# Altium footprint library PcbLib1.PcbLib: 1016 footprints (part 52 of 64)
Each footprint in its own frame and in the unit in brackets; x right, y up, seen from the top. Pads: shape width x height; smd on the part's side, far side on the other; paste and mask are expansions set on the pad; w line width, h text height; cw(c..) or ccw(c..) is an arc to the next point about the centre after c.
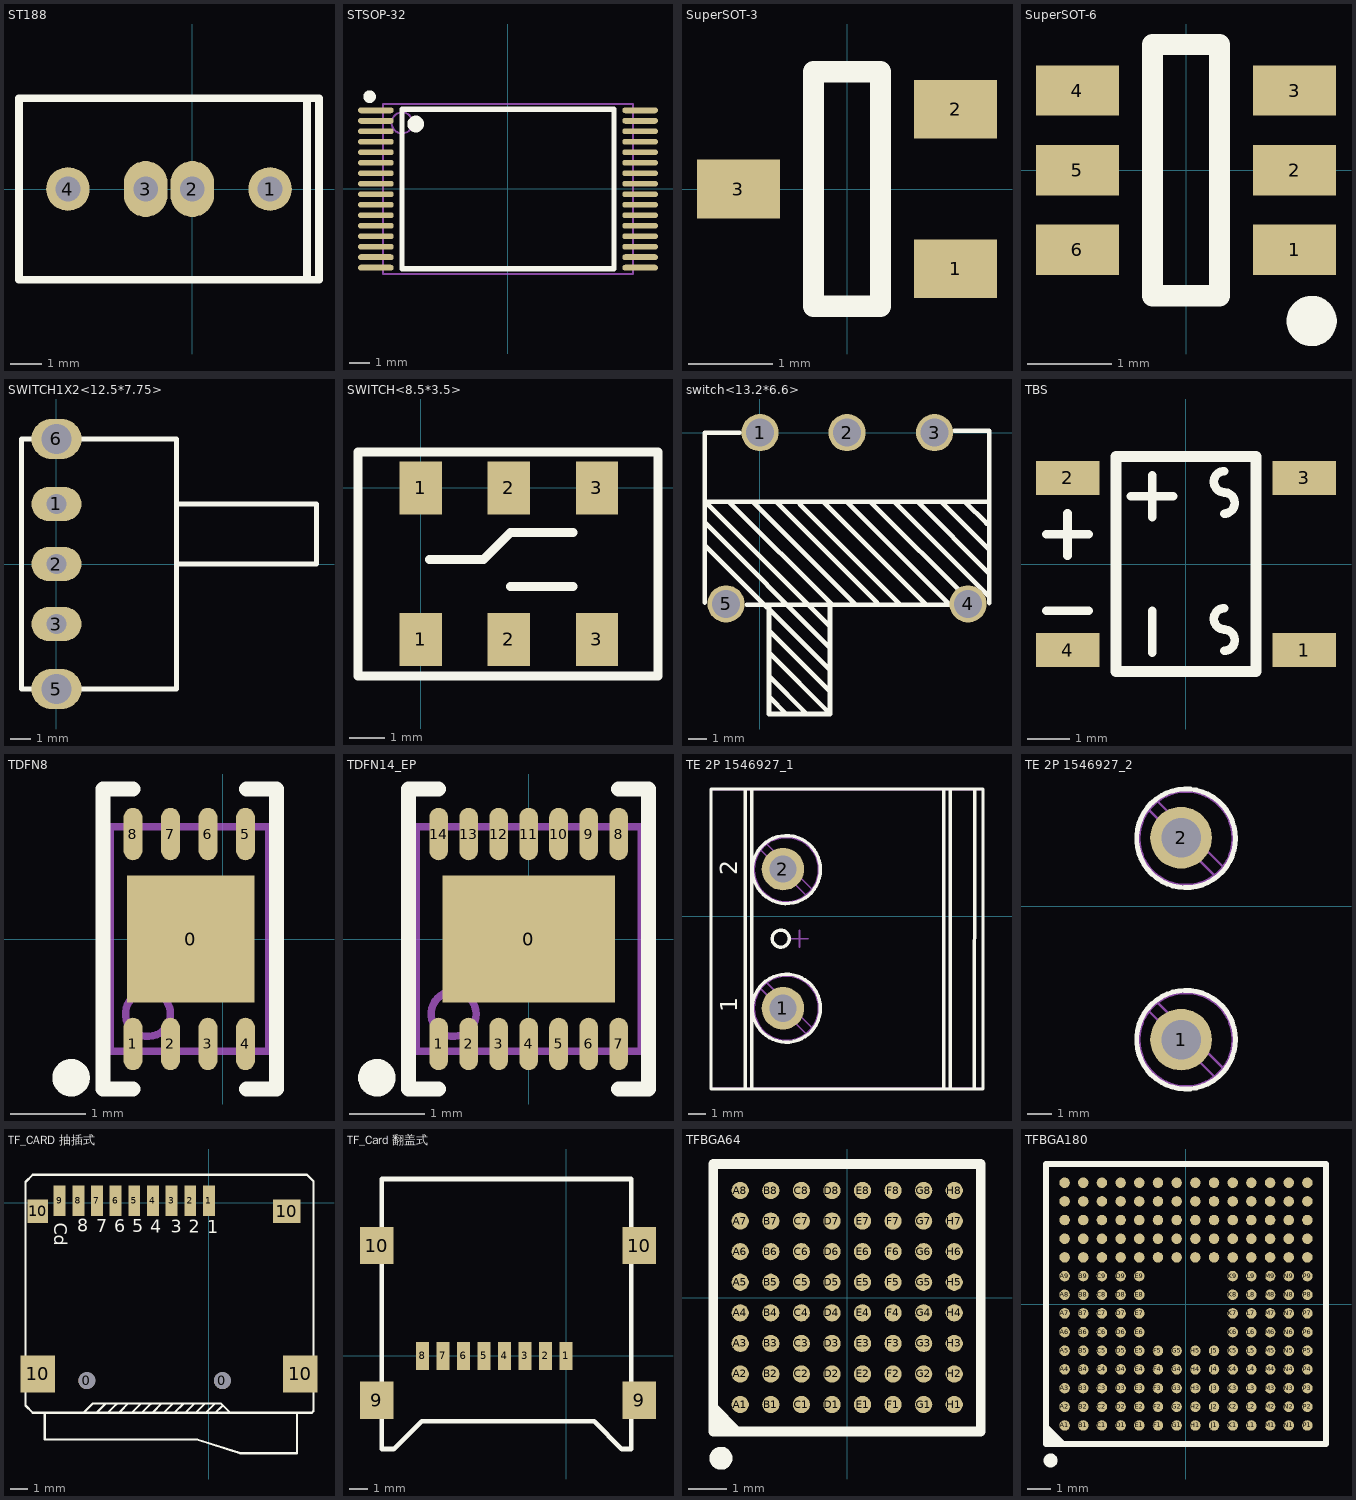
[diagram p51: the footprints below, top view; thin cyan lines are the x and y axes]

## ST188 [mm]
pads (4):
  round 1.4 hole 0.8: 1(2.5,0) 4(-4,0)
  oval 1.4x1.8 hole 0.8: 2(0,0) 3(-1.5,0)
Top Overlay:
  lines w0.254: 3.695,-2.921 3.695,2.921 ; -5.576,-2.921 -5.576,2.921 4.076,2.921 4.076,-2.921 -5.576,-2.921
3D body "ST188-.STEP": height 8.2, standoff -3.5, extent -5.449,-2.75 3.951,2.75

## STSOP-32 [mm]
pads (32):
  oval 1.7x0.28 smd mask+0.051: 1(-6.3,3.75) 2(-6.3,3.25) 3(-6.3,2.75) 4(-6.3,2.25) 5(-6.3,1.75) 6(-6.3,1.25) 7(-6.3,0.75) 8(-6.3,0.25) 9(-6.3,-0.25) 10(-6.3,-0.75) 11(-6.3,-1.25) 12(-6.3,-1.75) 13(-6.3,-2.25) 14(-6.3,-2.75) 15(-6.3,-3.25) 16(-6.3,-3.75) 17(6.3,-3.75) 18(6.3,-3.25) 19(6.3,-2.75) 20(6.3,-2.25) 21(6.3,-1.75) 22(6.3,-1.25) 23(6.3,-0.75) 24(6.3,-0.25) 25(6.3,0.25) 26(6.3,0.75) 27(6.3,1.25) 28(6.3,1.75) 29(6.3,2.25) 30(6.3,2.75) 31(6.3,3.25) 32(6.3,3.75)
Top Overlay:
  circle w0.4: c-4.4,3.1 r0.2
  circle w0.3: c-6.6,4.4 r0.15
  lines w0.254: -5.05,-3.8 -5.05,3.8 5.05,3.8 5.05,-3.8 -5.05,-3.8
Mechanical 13:
  circle w0.1: c-5.05,3.15 r0.5
  lines w0.1: -5.95,-4.05 -5.95,4.05 5.95,4.05 5.95,-4.05 -5.95,-4.05

## SuperSOT-3 [mm] "= SSOT-3"
pads (3):
  rect 0.99x0.7 smd: 1(1.295,-0.95) 2(1.295,0.95) 3(-1.295,0)
Top Overlay:
  lines w0.254: -0.4,-1.4 0.4,-1.4 0.4,1.4 -0.4,1.4 -0.4,-1.4

## SuperSOT-6 [mm] "= SSOT-6"
pads (6):
  rect 0.99x0.6 smd: 1(1.295,-0.95) 2(1.295,0) 3(1.295,0.95) 4(-1.295,0.95) 5(-1.295,0) 6(-1.295,-0.95)
Top Overlay:
  circle w0.3: c1.5,-1.8 r0.15
  lines w0.254: -0.4,-1.5 0.4,-1.5 0.4,1.5 -0.4,1.5 -0.4,-1.5

## SWITCH1X2<12.5*7.75> [mm]
pads (5):
  oval 2.5x1.7 hole 1: 1(0,3) 2(0,0) 3(0,-3)
  oval 2.5x2 hole 1.5: 5(0,-6.25) 6(0,6.25)
Top Overlay:
  lines w0.254: 6,0 13,0 13,3 6,3 ; -1.75,-6.25 0,-6.25 6,-6.25 6,6.25 0,6.25 -1.5,6.25 -1.75,6.25 -1.75,-6.25
3D body "User Library-SLIDE SWITCH SS12F23.STEP": height 5.75, standoff -3.35, extent -0.608,-6.523 12.292,6.477

## SWITCH<8.5*3.5> [mm]
pads (6):
  rect 1.2x1.5 smd mask+0.051: 1(0,-4.3) 1(0,0) 2(2.5,-4.3) 2(2.5,0) 3(5,-4.3) 3(5,0)
Top Overlay:
  lines w0.254: 0.254,-2.032 1.778,-2.032 2.54,-1.27 4.318,-1.27 ; 2.54,-2.794 4.318,-2.794 ; -1.778,-5.334 -1.778,1.016 6.731,1.016 6.731,-4.826 6.731,-5.334 -1.778,-5.334

## switch<13.2*6.6> [mm]
pads (5):
  round 2 hole 1.5 mask+0.051: 1(0.025,0) 2(4.7,0) 3(9.4,0) 4(11.2,-9.2) 5(-1.8,-9.2)
Top Overlay:
  lines w0.254: -2.946,-9.119 -2.946,0 -1.067,0 ; -2.946,-4.826 3.772,-11.544 ; -2.921,-6.071 3.785,-12.776 ; -2.908,-3.708 3.753,-10.37 ; -2.896,-3.708 12.339,-3.708 12.288,-3.759 ; -1.642,-3.708 3.865,-9.216 ; -0.686,-9.246 10.189,-9.246 ; -0.376,-3.708 5.136,-9.22 ; 0.508,-14.199 1.422,-15.113 ; 0.508,-11.659 0.508,-11.836 3.785,-15.113 ; 0.508,-10.592 0.508,-10.643 3.785,-13.919 ; 0.508,-9.271 0.508,-15.113 3.785,-15.113 ; 0.521,-13.094 2.54,-15.113 ; 0.891,-3.708 6.326,-9.144 ; 2.157,-3.835 7.567,-9.246 ; 3.424,-3.708 8.935,-9.22 ; 3.785,-9.296 3.785,-15.113 ; 4.69,-3.708 10.189,-9.207 ; 5.956,-3.708 11.341,-9.093 ; 7.223,-3.708 12.286,-8.771 ; 8.489,-3.708 12.322,-7.541 ; 9.756,-3.708 12.245,-6.198 ; 10.465,0.102 12.334,0.102 12.339,0.096 12.339,-9.149 ; 11.022,-3.708 12.19,-4.877

## TBS [mm]
pads (4):
  rect 1.5x0.8 smd: 1(2.794,-2.032) 2(-2.794,2.032) 3(2.794,2.032) 4(-2.794,-2.032)
Top Overlay:
  lines w0.203: -3.3,-1.1 -2.3,-1.1 ; -3.3,0.7 -2.3,0.7 ; -2.8,0.2 -2.8,1.2 ; -1.3,1.6 -0.3,1.6 ; -0.8,-2.1 -0.8,-1.1 ; -0.8,1.1 -0.8,2.1 ; 0.9,-2.05 ccw(c0.9,-1.8) 0.9,-1.55 ; 0.9,1.19 ccw(c0.9,1.44) 0.9,1.69 ; 0.908,-1.545 cw(c0.908,-1.295) 0.908,-1.045 ; 0.908,1.695 cw(c0.908,1.945) 0.908,2.195
  lines w0.254: -1.651,-2.54 -1.651,2.54 1.651,2.54 1.651,-2.54 -1.651,-2.54

## TDFN8 [mm]
pads (9):
  rect 1.7x1.7 smd mask+0.051: 0(-0.432,0)
  oval 0.25x0.7 smd mask+0.051: 1(-1.2,-1.4) 2(-0.7,-1.4) 3(-0.2,-1.4) 4(0.3,-1.4) 5(0.3,1.4) 6(-0.2,1.4) 7(-0.7,1.4) 8(-1.2,1.4)
Top Overlay:
  circle w0.25: c-2.025,-1.85 r0.125
  lines w0.2: -1.2,-2 -1.6,-2 -1.6,2 -1.2,2 ; 0.311,-2 0.711,-2 0.711,2 0.311,2
Mechanical 13:
  circle w0.1: c-1,-1 r0.3
  lines w0.1: -1.5,-1.5 0.61,-1.5 0.61,1.5 -1.5,1.5 -1.5,-1.5
3D body "User Library-TDFN-8-1.STEP": height 0.8, standoff 0, extent -1.441,-1.5 0.559,1.5

## TDFN14_EP [mm]
pads (15):
  rect 2.3x1.7 smd mask+0.051: 0(0,0)
  oval 0.25x0.7 smd mask+0.051: 1(-1.2,-1.4) 2(-0.8,-1.4) 3(-0.4,-1.4) 4(0,-1.4) 5(0.4,-1.4) 6(0.8,-1.4) 7(1.2,-1.4) 8(1.2,1.4) 9(0.8,1.4) 10(0.4,1.4) 11(0,1.4) 12(-0.4,1.4) 13(-0.8,1.4) 14(-1.2,1.4)
Top Overlay:
  circle w0.25: c-2.025,-1.85 r0.125
  lines w0.2: -1.2,-2 -1.6,-2 -1.6,2 -1.2,2 ; 1.2,-2 1.6,-2 1.6,2 1.2,2
Mechanical 13:
  circle w0.1: c-1,-1 r0.3
  lines w0.1: -1.5,-1.5 1.5,-1.5 1.5,1.5 -1.5,1.5 -1.5,-1.5

## TE 2P 1546927_1 [mm]
pads (2):
  round 2.5 hole 1.6: 1(10.617,-5.41) 2(10.617,2.769)
Top Overlay:
  circle w0.2: c10.482,-1.321 r0.5
  circle w0.2: c10.817,-5.41 r2
  circle w0.2: c10.817,2.743 r2
  lines w0.2: 6.382,-10.16 6.382,7.48 22.377,7.48 ; 6.401,-10.16 22.38,-10.16 22.38,7.48 ; 8.403,-10.16 8.407,7.468 ; 8.784,-10.135 8.784,7.468 ; 20.063,-10.109 20.063,7.468 ; 20.447,-10.135 20.454,7.468 ; 21.869,-10.135 21.883,7.442
  text "2" at 7.938,2.4 h1
  text "1" at 7.938,-5.645 h1
Mechanical 8:
  lines w0.1: 10.117,-5.41 10.617,-5.41 ; 10.117,2.743 10.617,2.743 ; 10.617,-5.91 10.617,-5.41 ; 10.617,-4.91 10.617,-5.41 ; 10.617,2.243 10.617,2.743 ; 10.617,3.243 10.617,2.743 ; 11.082,-1.321 11.582,-1.321 ; 11.117,-5.41 10.617,-5.41 ; 11.117,2.743 10.617,2.743 ; 11.582,-1.821 11.582,-1.321 ; 11.582,-0.821 11.582,-1.321 ; 12.082,-1.321 11.582,-1.321
Mechanical 14:
  circle w0.1: c10.817,2.743 r2
  circle w0.1: c10.817,-5.41 r2
  circle w0.1: c10.482,-1.321 r0.5
  circle w0.1: c10.817,2.743 r1.891
  circle w0.1: c10.817,-5.41 r1.891
  lines w0.1: 6.382,-10.109 6.382,7.442 22.377,7.442 ; 6.401,-10.109 22.38,-10.109 22.38,7.442 ; 8.403,-10.084 8.407,7.417 ; 8.783,-10.084 8.788,7.442 ; 9.315,-4.261 11.966,-6.913 ; 9.315,3.892 11.966,1.241 ; 9.668,-3.908 12.32,-6.559 ; 9.668,4.246 12.32,1.594 ; 20.063,-10.16 20.063,7.417 ; 20.447,7.417 20.454,-10.135 ; 21.869,7.417 21.883,-10.16
  text "2" at 7.938,2.4 h1
  text "1" at 7.938,-5.645 h1
3D body "c-1546927-2-a-3d.stp": height 14.99, standoff -5.08, extent 6.375,-10.198 22.435,7.506

## TE 2P 1546927_2 [mm]
pads (2):
  round 2.5 hole 1.6: 1(10.617,-5.41) 2(10.617,2.769)
Top Overlay:
  circle w0.2: c10.817,2.743 r2
  circle w0.2: c10.817,-5.41 r2
Mechanical 8:
  lines w0.1: 10.117,-5.41 10.617,-5.41 ; 10.117,2.743 10.617,2.743 ; 10.617,-5.91 10.617,-5.41 ; 10.617,-4.91 10.617,-5.41 ; 10.617,2.243 10.617,2.743 ; 10.617,3.243 10.617,2.743 ; 11.117,-5.41 10.617,-5.41 ; 11.117,2.743 10.617,2.743
Mechanical 14:
  circle w0.1: c10.817,-5.41 r1.891
  circle w0.1: c10.817,2.743 r1.891
  circle w0.1: c10.817,-5.41 r2
  circle w0.1: c10.817,2.743 r2
  lines w0.1: 9.315,-4.261 11.966,-6.913 ; 9.315,3.892 11.966,1.241 ; 9.668,-3.908 12.32,-6.559 ; 9.668,4.246 12.32,1.594

## TF_CARD 抽插式 [mm]
pads (15):
  round 1 hole 1 unplated: 0(-7.2,-10.5) 0(0.8,-10.5)
  rect 0.7x1.8 smd: 1(0,0.127) 2(-1.1,0.127) 3(-2.2,0.127) 4(-3.3,0.127) 5(-4.4,0.127) 6(-5.5,0.127) 7(-6.6,0.127) 8(-7.7,0.127) 9(-8.8,0.127)
  rect 2.032x2.2 smd: 10(-10.1,-10.1) 10(5.4,-10.1)
  rect 1.2x1.4 smd: 10(-10.1,-0.5)
  rect 1.6x1.4 smd: 10(4.6,-0.5)
Top Overlay:
  lines w0.127: -9.677,-12.395 -9.677,-13.97 -0.686,-13.97 ; -6.629,-12.395 -6.096,-11.862 -6.096,-11.836 ; -5.969,-12.395 -5.461,-11.887 -5.461,-11.836 ; -5.232,-12.395 -5.232,-12.319 -4.75,-11.836 ; -4.547,-12.395 -3.988,-11.836 -3.962,-11.836 ; -3.962,-12.395 -3.429,-11.862 -3.429,-11.836 ; -3.327,-12.395 -2.769,-11.836 -2.667,-11.836 ; -2.667,-12.395 -2.108,-11.836 -2.083,-11.836 ; -2.032,-12.395 -1.499,-11.862 -1.499,-11.836 ; -1.397,-12.395 -0.838,-11.836 -0.711,-11.836 ; -0.762,-12.395 -0.203,-11.836 -0.178,-11.836 ; -0.711,-13.97 1.854,-14.783 5.207,-14.783 5.207,-12.421 ; -0.178,-12.395 0.381,-11.836 ; 0.381,-12.395 0.787,-11.989 0.864,-11.989 ; -10.389,-12.395 -7.391,-12.395 -6.833,-11.836 0.711,-11.836 1.27,-12.395 6.071,-12.395 ; -10.389,-12.395 6.071,-12.395 ; -10.389,-12.395 -10.82,-11.963 -10.82,1.219 -10.389,1.651 5.791,1.651 6.172,1.27 6.172,-12.294 6.071,-12.395
  text "1" at -0.102,-1.803 h0.76
  text "2" at -1.194,-1.778 h0.76
  text "3" at -2.261,-1.778 h0.76
  text "4" at -3.454,-1.778 h0.76
  text "5" at -4.521,-1.753 h0.76
  text "6" at -5.588,-1.753 h0.76
  text "7" at -6.655,-1.753 h0.76
  text "8" at -7.772,-1.727 h0.76
  text "Cd" at -9.119,-1.168 h0.76
3D body "sdcard.STEP": height 1.8, standoff -0.7, extent -10.372,-14.725 5.901,0.469

## TF_Card 翻盖式 [mm]
height 2
pads (12):
  rect 0.7x1.5 smd: 1(0,0) 2(-1.1,0) 3(-2.2,0) 4(-3.3,0) 5(-4.4,0) 6(-5.5,0) 7(-6.6,0) 8(-7.7,0)
  rect 1.8x2 smd: 9(-10.168,-2.378) 9(3.932,-2.378) 10(-10.168,5.922) 10(3.932,5.922)
Top Overlay:
  lines w0.254: -9.9,-5 -9.9,9.5 0,9.5 3.5,9.5 3.5,-5 3,-5 1.5,-3.5 -7.75,-3.5 -9.25,-5 -9.9,-5
3D body "User Library-5009010801.STEP": height 1.93, standoff -0.02, extent -10.5,-5 4.1,9.5

## TFBGA64 [mm]
pads (64):
  round 0.45 smd mask+0.051: A1(-2.8,-2.8) A2(-2.8,-2) A3(-2.8,-1.2) A4(-2.8,-0.4) A5(-2.8,0.4) A6(-2.8,1.2) A7(-2.8,2) A8(-2.8,2.8) B1(-2,-2.8) B2(-2,-2) B3(-2,-1.2) B4(-2,-0.4) B5(-2,0.4) B6(-2,1.2) B7(-2,2) B8(-2,2.8) C1(-1.2,-2.8) C2(-1.2,-2) C3(-1.2,-1.2) C4(-1.2,-0.4) C5(-1.2,0.4) C6(-1.2,1.2) C7(-1.2,2) C8(-1.2,2.8) D1(-0.4,-2.8) D2(-0.4,-2) D3(-0.4,-1.2) D4(-0.4,-0.4) D5(-0.4,0.4) D6(-0.4,1.2) D7(-0.4,2) D8(-0.4,2.8) E1(0.4,-2.8) E2(0.4,-2) E3(0.4,-1.2) E4(0.4,-0.4) E5(0.4,0.4) E6(0.4,1.2) E7(0.4,2) E8(0.4,2.8) F1(1.2,-2.8) F2(1.2,-2) F3(1.2,-1.2) F4(1.2,-0.4) F5(1.2,0.4) F6(1.2,1.2) F7(1.2,2) F8(1.2,2.8) G1(2,-2.8) G2(2,-2) G3(2,-1.2) G4(2,-0.4) G5(2,0.4) G6(2,1.2) G7(2,2) G8(2,2.8) H1(2.8,-2.8) H2(2.8,-2) H3(2.8,-1.2) H4(2.8,-0.4) H5(2.8,0.4) H6(2.8,1.2) H7(2.8,2) H8(2.8,2.8)
Top Overlay:
  circle w0.3: c-3.306,-4.206 r0.15
  region: -3.456,-2.756 -2.756,-3.456 -3.456,-3.456
  lines w0.254: -3.506,-3.506 3.494,-3.506 3.494,3.494 -3.506,3.494 -3.506,-3.506

## TFBGA180 [mm]
pads (180):
  round 0.45 smd mask+0.051: A1(-5.2,-5.2) A2(-5.2,-4.4) A3(-5.2,-3.6) A4(-5.2,-2.8) A5(-5.2,-2) A6(-5.2,-1.2) A7(-5.2,-0.4) A8(-5.2,0.4) A9(-5.2,1.2) A10(-5.2,2) A11(-5.2,2.8) A12(-5.2,3.6) A13(-5.2,4.4) A14(-5.2,5.2) B1(-4.4,-5.2) B2(-4.4,-4.4) B3(-4.4,-3.6) B4(-4.4,-2.8) B5(-4.4,-2) B6(-4.4,-1.2) B7(-4.4,-0.4) B8(-4.4,0.4) B9(-4.4,1.2) B10(-4.4,2) B11(-4.4,2.8) B12(-4.4,3.6) B13(-4.4,4.4) B14(-4.4,5.2) C1(-3.6,-5.2) C2(-3.6,-4.4) C3(-3.6,-3.6) C4(-3.6,-2.8) C5(-3.6,-2) C6(-3.6,-1.2) C7(-3.6,-0.4) C8(-3.6,0.4) C9(-3.6,1.2) C10(-3.6,2) C11(-3.6,2.8) C12(-3.6,3.6) C13(-3.6,4.4) C14(-3.6,5.2) D1(-2.8,-5.2) D2(-2.8,-4.4) D3(-2.8,-3.6) D4(-2.8,-2.8) D5(-2.8,-2) D6(-2.8,-1.2) D7(-2.8,-0.4) D8(-2.8,0.4) D9(-2.8,1.2) D10(-2.8,2) D11(-2.8,2.8) D12(-2.8,3.6) D13(-2.8,4.4) D14(-2.8,5.2) E1(-2,-5.2) E2(-2,-4.4) E3(-2,-3.6) E4(-2,-2.8) E5(-2,-2) E6(-2,-1.2) E7(-2,-0.4) E8(-2,0.4) E9(-2,1.2) E10(-2,2) E11(-2,2.8) E12(-2,3.6) E13(-2,4.4) E14(-2,5.2) F1(-1.2,-5.2) F2(-1.2,-4.4) F3(-1.2,-3.6) F4(-1.2,-2.8) F5(-1.2,-2) F10(-1.2,2) F11(-1.2,2.8) F12(-1.2,3.6) F13(-1.2,4.4) F14(-1.2,5.2) G1(-0.4,-5.2) G2(-0.4,-4.4) G3(-0.4,-3.6) G4(-0.4,-2.8) G5(-0.4,-2) G10(-0.4,2) G11(-0.4,2.8) G12(-0.4,3.6) G13(-0.4,4.4) G14(-0.4,5.2) H1(0.4,-5.2) H2(0.4,-4.4) H3(0.4,-3.6) H4(0.4,-2.8) H5(0.4,-2) H10(0.4,2) H11(0.4,2.8) H12(0.4,3.6) H13(0.4,4.4) H14(0.4,5.2) J1(1.2,-5.2) J2(1.2,-4.4) J3(1.2,-3.6) J4(1.2,-2.8) J5(1.2,-2) J10(1.2,2) J11(1.2,2.8) J12(1.2,3.6) J13(1.2,4.4) J14(1.2,5.2) K1(2,-5.2) K2(2,-4.4) K3(2,-3.6) K4(2,-2.8) K5(2,-2) K6(2,-1.2) K7(2,-0.4) K8(2,0.4) K9(2,1.2) K10(2,2) K11(2,2.8) K12(2,3.6) K13(2,4.4) K14(2,5.2) L1(2.8,-5.2) L2(2.8,-4.4) L3(2.8,-3.6) L4(2.8,-2.8) L5(2.8,-2) L6(2.8,-1.2) L7(2.8,-0.4) L8(2.8,0.4) L9(2.8,1.2) L10(2.8,2) L11(2.8,2.8) L12(2.8,3.6) L13(2.8,4.4) L14(2.8,5.2) M1(3.6,-5.2) M2(3.6,-4.4) M3(3.6,-3.6) M4(3.6,-2.8) M5(3.6,-2) M6(3.6,-1.2) M7(3.6,-0.4) M8(3.6,0.4) M9(3.6,1.2) M10(3.6,2) M11(3.6,2.8) M12(3.6,3.6) M13(3.6,4.4) M14(3.6,5.2) N1(4.4,-5.2) N2(4.4,-4.4) N3(4.4,-3.6) N4(4.4,-2.8) N5(4.4,-2) N6(4.4,-1.2) N7(4.4,-0.4) N8(4.4,0.4) N9(4.4,1.2) N10(4.4,2) N11(4.4,2.8) N12(4.4,3.6) N13(4.4,4.4) N14(4.4,5.2) P1(5.2,-5.2) P2(5.2,-4.4) P3(5.2,-3.6) P4(5.2,-2.8) P5(5.2,-2) P6(5.2,-1.2) P7(5.2,-0.4) P8(5.2,0.4) P9(5.2,1.2) P10(5.2,2) P11(5.2,2.8) P12(5.2,3.6) P13(5.2,4.4) P14(5.2,5.2)
Top Overlay:
  circle w0.3: c-5.8,-6.7 r0.15
  region: -5.95,-5.15 -5.15,-5.95 -5.95,-5.95
  lines w0.254: -6,-6 -6,6 6,6 6,-6 -6,-6